# Altium footprint library 3D封装库.PcbLib: 716 footprints (part 44 of 45)
Each footprint in its own frame and in the unit in brackets; x right, y up, seen from the top. Pads: shape width x height; smd on the part's side, far side on the other; paste and mask are expansions set on the pad; w line width, h text height; cw(c..) or ccw(c..) is an arc to the next point about the centre after c.
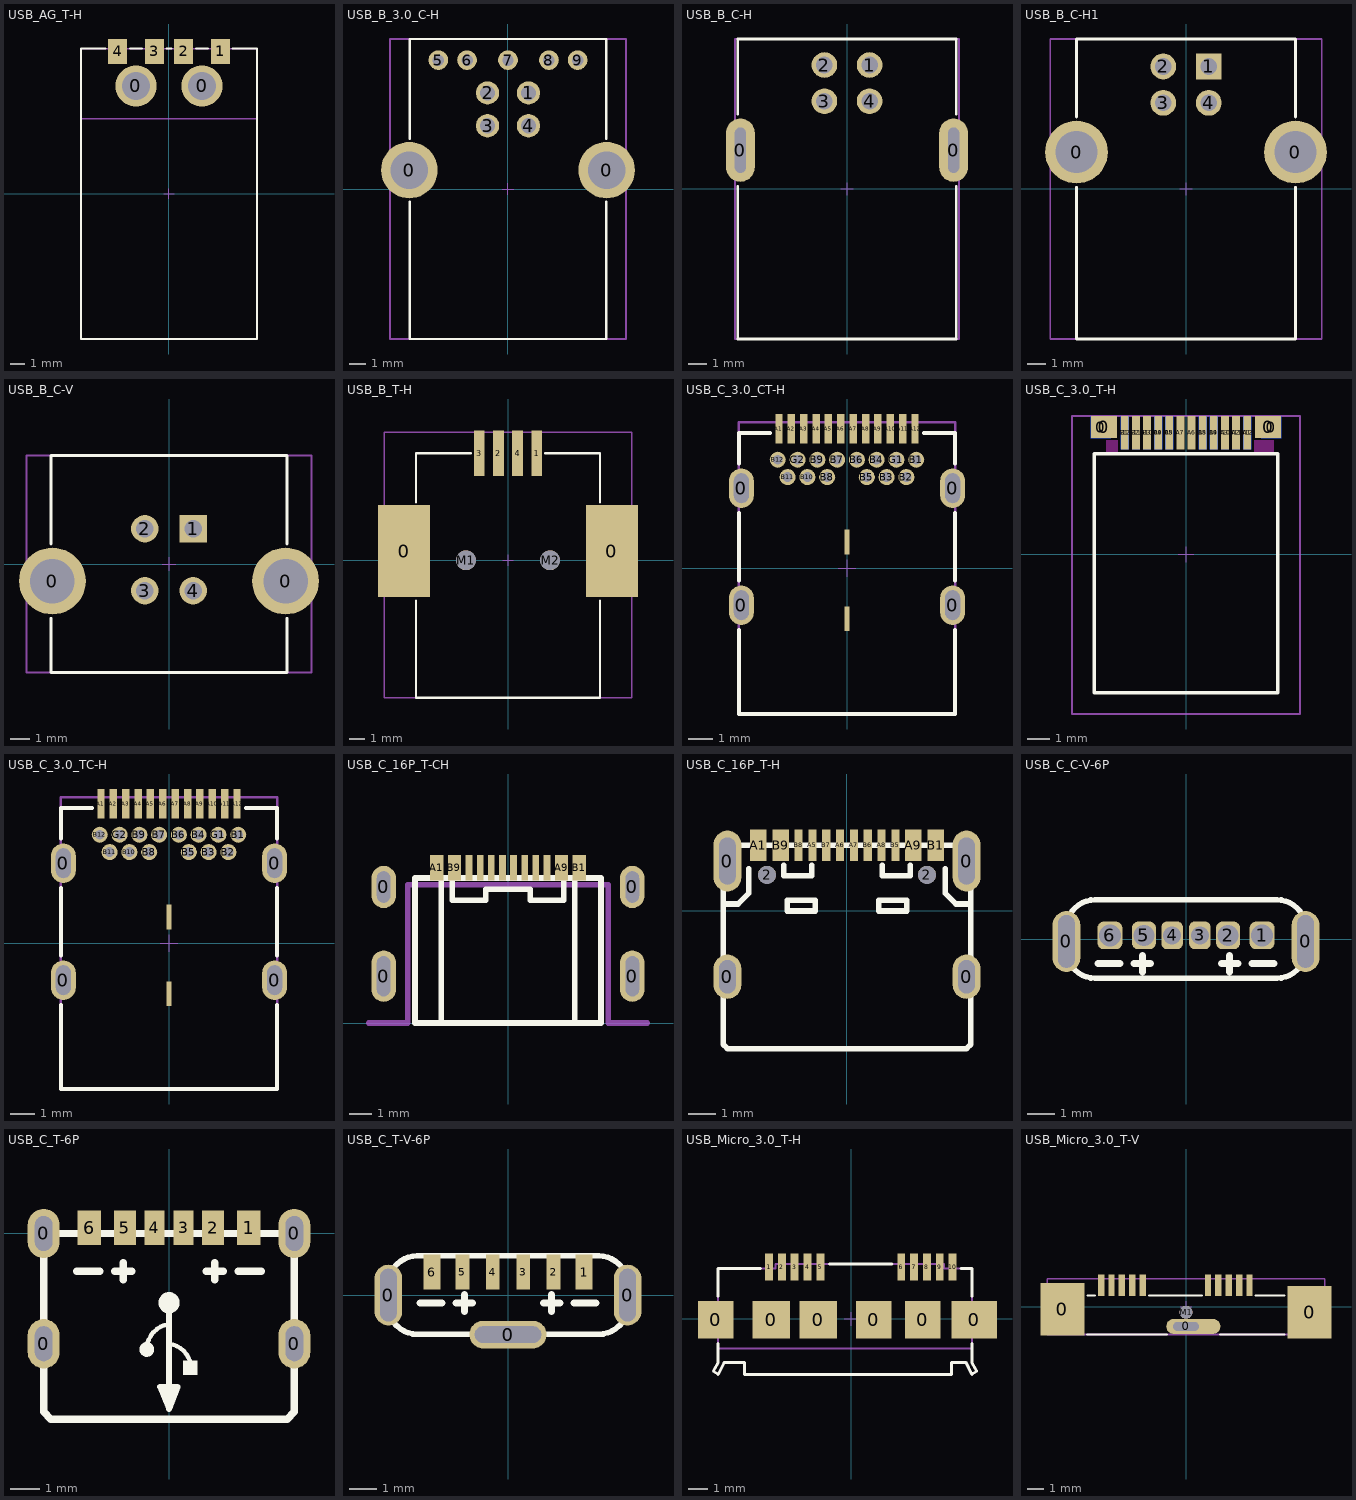
[diagram p43: the footprints below, top view; thin cyan lines are the x and y axes]

## USB_AG_T-H [mm] "USB 2.0 Plug Type A SMT with Clip"
height 19.8
pads (6):
  round 2.8 hole 1.9: 0(-2.25,7.35) 0(2.25,7.35)
  rect 1.3x1.7 smd: 1(3.5,9.7) 2(1,9.7) 3(-1,9.7) 4(-3.5,9.7)
Top Overlay:
  lines w0.15: -4.35,9.9 -6,9.9 -6,-9.9 6,-9.9 6,9.9 4.35,9.9 ; -2.65,9.9 -1.85,9.9 ; -0.15,9.9 0.15,9.9 ; 1.85,9.9 2.65,9.9
Mechanical 1:
  lines w0.1: -6,5.1 6,5.1
  text "PCB Edge" at -2,4.05 h1
Mechanical 13:
  lines w0.1: -6,-9.9 6,-9.9 6,9.9 -6,9.9 -6,-9.9
Mechanical 15:
  lines w0.05: -0.35,0 0.35,0 ; 0,-0.35 0,0.35
3D body "629004113921.stp": height 2.25, standoff -2.25, extent -6,-9.9 6,9.9

## USB_B_3.0_C-H [mm] "USB 3.0 Type B Horizontal"
height 12.9
pads (11):
  round 3.45 hole 2.3: 0(-6.02,1.15) 0(6.02,1.15)
  round 1.42 hole 0.92: 1(1.25,5.86) 2(-1.25,5.86) 3(-1.25,3.86) 4(1.25,3.86)
  round 1.2 hole 0.7: 5(-4.25,7.86) 6(-2.5,7.86) 7(0,7.86) 8(2.5,7.86) 9(4.25,7.86)
Top Overlay:
  lines w0.15: -6,-0.78 -6,-9.15 6,-9.15 6,-0.78 ; -6,3.07 -6,9.15 6,9.15 6,3.07
Mechanical 13:
  lines w0.1: -7.2,-9.15 7.2,-9.15 7.2,9.15 -7.2,9.15 -7.2,-9.15
Mechanical 15:
  lines w0.05: -0.35,0 0.35,0 ; 0,-0.35 0,0.35
3D body "692221030100.stp": height 12.95, standoff -3.18, extent -7.2,-9.15 7.2,9.15

## USB_B_C-H [mm] "USB Type B Horizontal THR"
height 11
pads (6):
  oval 1.6x3.5 hole 0.6 slot 2.5 at 90 deg: 0(-5.9,2.15) 0(5.9,2.15)
  round 1.42 hole 0.92: 1(1.25,6.86) 2(-1.25,6.86) 3(-1.25,4.86) 4(1.25,4.86)
Top Overlay:
  lines w0.15: -6.05,0.15 -6.05,-8.3 6.05,-8.3 6.05,0.15 ; -6.05,4.15 -6.05,8.3 6.05,8.3 6.05,4.15
Mechanical 13:
  lines w0.1: -6.2,-8.3 -6.2,8.3 6.2,8.3 6.2,-8.3 -6.2,-8.3
Mechanical 15:
  lines w0.05: -0.35,0 0.35,0 ; 0,-0.35 0,0.35
3D body "61410416121R.stp": height 11.1, standoff -2.1, extent -6.2,-8.3 6.2,8.3

## USB_B_C-H1 [mm] "USB 2.0 Type B Horizontal"
height 11.05
pads (6):
  round 3.45 hole 2.3: 0(-6.02,2.03) 0(6.02,2.03)
  rect 1.42x1.42 hole 0.92: 1(1.25,6.74)
  round 1.42 hole 0.92: 2(-1.25,6.74) 3(-1.25,4.74) 4(1.25,4.74)
Top Overlay:
  lines w0.15: -6.02,0.1 -6.02,-8.25 6.02,-8.25 6.02,0.1 ; -6.02,3.96 -6.02,8.25 6.02,8.25 6.02,3.96
Mechanical 13:
  lines w0.1: -7.47,-8.25 7.47,-8.25 7.47,8.25 -7.47,8.25 -7.47,-8.25
Mechanical 15:
  lines w0.05: -0.35,0 0.35,0 ; 0,-0.35 0,0.35
3D body "61400416121.stp": height 11.1, standoff -3.76, extent -7.484,-8.25 7.484,8.25

## USB_B_C-V [mm] "USB 2.0 Type B Vertical"
height 16.1
pads (6):
  round 3.45 hole 2.3: 0(-6.02,-0.88) 0(6.02,-0.88)
  rect 1.42x1.42 hole 0.92: 1(1.25,1.82)
  round 1.42 hole 0.92: 2(-1.25,1.82) 3(-1.25,-1.38) 4(1.25,-1.38)
Top Overlay:
  lines w0.15: -6.1,-2.8 -6.1,-5.6 6.1,-5.6 6.1,-2.8 ; -6.1,1.04 -6.1,5.6 6.1,5.6 6.1,1.04
Mechanical 13:
  lines w0.1: -7.35,-5.6 -7.35,5.6 7.35,5.6 7.35,-5.6 -7.35,-5.6
Mechanical 15:
  lines w0.05: -0.35,0 0.35,0 ; 0,-0.35 0,0.35
3D body "61400413321.stp": height 16.15, standoff -4.17, extent -7.35,-5.6 7.35,5.6

## USB_B_T-H [mm] "USB 2.0 Type B SMT Horizontal"
height 11.5
pads (8):
  rect 3.4x6.04 smd: 0(-6.8,0.6) 0(6.8,0.6)
  rect 0.7x3 smd: 1(1.875,7) 2(-0.625,7) 3(-1.875,7) 4(0.625,7)
  round 1.3 hole 1.3 unplated: M1(-2.75,0) M2(2.75,0)
Top Overlay:
  lines w0.15: -6.02,-2.64 -6.02,-9 6.02,-9 6.02,-2.64 ; -6.02,3.8 -6.02,7 -2.43,7 ; 2.43,7 6.02,7 6.02,3.8
Mechanical 13:
  lines w0.1: -8.1,-9 8.1,-9 8.1,8.388 -8.1,8.388 -8.1,-9
Mechanical 15:
  lines w0.05: -0.35,0 0.35,0 ; 0,-0.35 0,0.35
3D body "62910416121.stp": height 11.16, standoff -0.81, extent -8.1,-9 8.1,8.388

## USB_C_3.0_CT-H [mm] "USB 3.1 Type C Receptacle Horizontal THR"
height 2.96
pads (32):
  oval 1x1.6 hole 0.6 slot 1.2 at 90 deg: 0(-4.27,-1.495) 0(-4.27,3.235) 0(4.27,-1.495) 0(4.27,3.235)
  rect 0.3x1.2 smd: A1(-2.75,5.635) A2(-2.25,5.635) A3(-1.75,5.635) A4(-1.25,5.635) A5(-0.75,5.635) A6(-0.25,5.635) A7(0.25,5.635) A8(0.75,5.635) A9(1.25,5.635) A10(1.75,5.635) A11(2.25,5.635) A12(2.75,5.635)
  round 0.65 hole 0.4: B1(2.8,4.385) B2(2.4,3.685) B3(1.6,3.685) B4(1.2,4.385) B5(0.8,3.685) B6(0.4,4.385) B7(-0.4,4.385) B8(-0.8,3.685) B9(-1.2,4.385) B10(-1.6,3.685) B11(-2.4,3.685) B12(-2.8,4.385) G1(2,4.385) G2(-2,4.385)
  rect 0.2x1 smd: ""(0,-2.045) ""(0,1.055)
Top Overlay:
  lines w0.15: -4.37,-2.485 -4.37,-5.895 4.37,-5.895 4.37,-2.485 ; -4.37,-0.495 -4.37,2.245 ; -4.37,4.225 -4.37,5.465 -3.1,5.465 ; 3.1,5.465 4.37,5.465 4.37,4.225 ; 4.37,-0.495 4.37,2.245
Mechanical 1:
  text "PCB Thickness 1.0mm" at -3.15,-6.65 h0.76
Mechanical 13:
  lines w0.1: -4.37,-5.895 -4.37,5.895 4.37,5.895 4.37,-5.895 -4.37,-5.895
Mechanical 15:
  lines w0.05: -0.35,0 0.35,0 ; 0,-0.35 0,0.35
3D body "632723100011.stp": height 3.05, standoff -1.81, extent -4.37,-5.895 4.37,5.899

## USB_C_3.0_T-H [mm] "USB 3.1 Type C Plug Horizontal SMT"
height 2.4
pads (26):
  rect 0.9x1 smd far side: 0(-3.825,5.725) 0(3.825,5.725)
  rect 1.18x1 smd: 0(-3.69,5.725) 0(3.69,5.725)
  rect 0.35x1.5 smd: A1(2.75,5.475) A2(2.25,5.475) A3(1.75,5.475) A4(1.25,5.475) A5(0.75,5.475) A6(0.25,5.475) A7(-0.25,5.475) A8(-0.75,5.475) A9(-1.25,5.475) A10(-1.75,5.475) A11(-2.25,5.475) A12(-2.75,5.475)
  rect 0.35x1.5 smd far side: B1(-2.75,5.475) B2(-2.25,5.475) B3(-1.75,5.475) B4(-1.25,5.475) B5(-0.75,5.475) B8(0.75,5.475) B9(1.25,5.475) B10(1.75,5.475) B11(2.25,5.475) B12(2.75,5.475)
Top Overlay:
  lines w0.15: -4.125,-6.225 -4.125,4.525 4.125,4.525 4.125,-6.225 -4.125,-6.225
Bottom Overlay:
  lines w0.15: -4.125,-6.225 4.125,-6.225 4.125,4.525 -4.125,4.525 -4.125,-6.225
Keep-Out Layer:
  board cut-out: -3.58,4.525 -3.58,5.125 -3.08,5.125 -3.08,4.525
  board cut-out: 3.075,4.525 3.075,5.125 3.945,5.125 3.945,4.525
Mechanical 1:
  text "PCB Thickness 0.8mm" at -3.5,-7.7 h0.76
Mechanical 13:
  lines w0.1: -5.125,-7.175 5.125,-7.175 5.125,6.225 -5.125,6.225 -5.125,-7.175
Mechanical 15:
  lines w0.05: -0.35,0 0.35,0 ; 0,-0.35 0,0.35
3D body "632712000011.stp": height 1.75, standoff -2.45, extent -5.125,-7.175 5.125,6.225

## USB_C_3.0_TC-H [mm] "USB 3.1 Type C Receptacle Horizontal THR"
height 2.96
pads (32):
  oval 1x1.6 hole 0.6 slot 1.2 at 90 deg: 0(-4.27,-1.495) 0(-4.27,3.235) 0(4.27,-1.495) 0(4.27,3.235)
  rect 0.3x1.2 smd: A1(-2.75,5.635) A2(-2.25,5.635) A3(-1.75,5.635) A4(-1.25,5.635) A5(-0.75,5.635) A6(-0.25,5.635) A7(0.25,5.635) A8(0.75,5.635) A9(1.25,5.635) A10(1.75,5.635) A11(2.25,5.635) A12(2.75,5.635)
  round 0.65 hole 0.4: B1(2.8,4.385) B2(2.4,3.685) B3(1.6,3.685) B4(1.2,4.385) B5(0.8,3.685) B6(0.4,4.385) B7(-0.4,4.385) B8(-0.8,3.685) B9(-1.2,4.385) B10(-1.6,3.685) B11(-2.4,3.685) B12(-2.8,4.385) G1(2,4.385) G2(-2,4.385)
  rect 0.2x1 smd: ""(0,-2.045) ""(0,1.055)
Top Overlay:
  lines w0.15: -4.37,-2.485 -4.37,-5.895 4.37,-5.895 4.37,-2.485 ; -4.37,-0.495 -4.37,2.245 ; -4.37,4.225 -4.37,5.465 -3.1,5.465 ; 3.1,5.465 4.37,5.465 4.37,4.225 ; 4.37,-0.495 4.37,2.245
Mechanical 1:
  text "PCB Thickness 1.6mm" at -3.5,-6.65 h0.76
Mechanical 13:
  lines w0.1: -4.37,-5.895 -4.37,5.895 4.37,5.895 4.37,-5.895 -4.37,-5.895
Mechanical 15:
  lines w0.05: -0.35,0 0.35,0 ; 0,-0.35 0,0.35
3D body "632723300011.stp": height 3.05, standoff -1.81, extent -4.37,-5.895 4.37,5.899

## USB_C_16P_T-CH [mm]
pads (16):
  oval 1.1x2.3 hole 0.6 slot 1.8 at 90 deg: 0(-5.575,2.1) 0(5.575,2.1)
  oval 1.1x1.9 hole 0.6 slot 1.4 at 90 deg: 0(-5.575,6.1) 0(5.575,6.1)
  rect 0.6x1.15 smd mask+0.05: A1(-3.2,6.96) A9(2.4,6.96) B1(3.2,6.96) B9(-2.4,6.96)
  rect 0.3x1.15 smd mask+0.05: A5(-1.25,6.96) A6(-0.25,6.96) A7(0.25,6.96) A8(1.25,6.96) B5(1.75,6.96) B6(0.75,6.96) B7(-0.75,6.96) B8(-1.75,6.96)
Top Overlay:
  lines w0.254: -3,0 -3,6.5 ; -2.5,6.5 -2.5,5.5 -1,5.5 -1,6 1,6 1,5.5 2.5,5.5 2.5,6.5 ; 3,0 3,6.5 ; -4.17,0 -4.17,6.5 4.17,6.5 4.17,0 -4.17,0
Mechanical 15:
  lines w0.254: -6.25,0 -4.5,0 -4.5,6.2 4.5,6.2 4.5,0 6.25,0
3D body "1768432.stp": height 2.22, standoff -0.94, extent -5.8,0 5.8,7.9

## USB_C_16P_T-H [mm]
pads (18):
  oval 1x1.6 hole 1.2 slot 0.6 at 0 deg: 0(-4.32,-2.375) 0(4.32,-2.375)
  oval 1x2.2 hole 1.7 slot 0.6 at 0 deg: 0(-4.32,1.805) 0(4.32,1.805)
  round 0.65 hole 0.65: 2(-2.89,1.305) 2(2.89,1.305)
  rect 0.6x1.15 smd mask+0.05: A1(-3.2,2.375) A9(2.4,2.375) B1(3.2,2.375) B9(-2.4,2.375)
  rect 0.3x1.15 smd mask+0.05: A5(-1.25,2.375) A6(-0.25,2.375) A7(0.25,2.375) A8(1.25,2.375) B5(1.75,2.375) B6(0.75,2.375) B7(-0.75,2.375) B8(-1.75,2.375)
Top Overlay:
  lines w0.203: -4.47,0.254 -3.937,0.254 -3.556,0.635 -3.556,1.524 ; -2.286,1.651 -2.286,1.27 -1.27,1.27 -1.27,1.651 ; 1.27,1.651 1.27,1.27 2.286,1.27 2.286,1.651 ; 3.556,1.524 3.556,0.635 3.937,0.254 4.47,0.254 ; -4.47,-4.823 -4.318,-4.975 4.318,-4.975 4.47,-4.823 4.47,2.375 -4.47,2.375 -4.47,-4.823 ; -2.159,0 -1.143,0 -1.143,0.381 -2.159,0.381 -2.159,0 ; 1.143,0 2.159,0 2.159,0.381 1.143,0.381 1.143,0
3D body "User Library-USB Type C Port (SMD Type).sldprt": height 3.25, standoff -0.95, extent -4.47,-5 4.47,2.9

## USB_C_C-V-6P [mm]
pads (8):
  oval 1x2.2 hole 0.6 slot 1.9 at 90 deg: 0(-4.32,-0.09) 0(4.32,-0.09)
  rrect50% 0.9x1 hole 0.8 mask+0.05: 1(2.75,0.13) 6(-2.75,0.13)
  rrect50% 0.86x1 hole 0.76 mask+0.05: 2(1.52,0.13) 5(-1.52,0.13)
  rrect50% 0.77x1 hole 0.65 mask+0.05: 3(0.5,0.13) 4(-0.5,0.13)
Top Overlay:
  lines w0.203: -4.325,-0.374 ccw(c-3.279,-0.374) -3.279,-1.42 3.279,-1.42 ccw(c3.279,-0.374) 4.325,-0.374 4.325,0.374 ccw(c3.279,0.374) 3.279,1.42 -3.279,1.42 ccw(c-3.279,0.374) -4.325,0.374 -4.325,-0.374
  lines w0.254: -3.18,-0.889 -2.38,-0.889 ; -1.88,-0.889 -1.28,-0.889 ; -1.58,-1.189 -1.58,-0.589 ; 1.28,-0.889 1.88,-0.889 ; 1.58,-1.189 1.58,-0.589 ; 2.38,-0.889 3.18,-0.889
3D body "TYPE_C_6p-V-C.STEP": height 6.83, standoff -0.76, extent -4.125,-1.2 4.125,1.2

## USB_C_T-6P [mm]
pads (10):
  oval 1.1x1.7 hole 0.6 slot 1.2 at 90 deg: 0(-4.32,-3.8) 0(-4.32,0) 0(4.32,-3.8) 0(4.32,0)
  rect 0.8x1.2 smd: 1(2.75,0.2) 6(-2.75,0.2)
  rect 0.76x1.2 smd: 2(1.52,0.2) 5(-1.52,0.2)
  rect 0.7x1.2 smd: 3(0.5,0.2) 4(-0.5,0.2)
Top Overlay:
  circle w0.254: c-0.767,-3.997 r0.127
  circle w0.381: c0.002,-2.388 r0.178
  region: 0.987,-4.369 0.477,-4.369 0.477,-4.879 0.987,-4.879
  lines w0.152: -0.768,-3.952 cw(c0.119,-4.004) 0,-3.123 ; 0,-3.8 cw(c-0.119,-4.681) 0.727,-4.411
  lines w0.203: 0,-5.282 0,-6.046 ; 0,-2.523 0,-6.046 ; 0,-6.046 -0.31,-5.284 0.3,-5.284 0,-6.046
  lines w0.254: -3.18,-1.3 -2.38,-1.3 ; -1.88,-1.3 -1.28,-1.3 ; -1.58,-1.6 -1.58,-1 ; 1.28,-1.3 1.88,-1.3 ; 1.58,-1.6 1.58,-1 ; 2.38,-1.3 3.18,-1.3 ; -4.32,-6.15 -4.07,-6.4 4.07,-6.4 4.32,-6.15 4.32,-3.8 4.32,0 -4.32,0 -4.32,-6.15
  lines w0.381: 0,-5.487 0,-5.385
3D body "User Library-USB_Type-C_6pin_Socket.sldprt": height 3.23, standoff -0.48, extent -4.47,-6.4 4.47,0.5

## USB_C_T-V-6P [mm]
pads (9):
  oval 1x2.2 hole 0.6 slot 1.9 at 90 deg: 0(-4.325,0) 0(4.325,0)
  oval 2.8x1 hole 0.6 slot 2.4 at 0 deg: 0(0,-1.43)
  rect 0.6x1.26 smd: 1(2.75,0.83) 6(-2.75,0.83)
  rect 0.5x1.26 smd: 2(1.65,0.83) 3(0.55,0.83) 4(-0.55,0.83) 5(-1.65,0.83)
Top Overlay:
  lines w0.203: -4.325,-0.374 ccw(c-3.279,-0.374) -3.279,-1.42 3.279,-1.42 ccw(c3.279,-0.374) 4.325,-0.374 4.325,0.374 ccw(c3.279,0.374) 3.279,1.42 -3.279,1.42 ccw(c-3.279,0.374) -4.325,0.374 -4.325,-0.374
  lines w0.254: -3.18,-0.289 -2.38,-0.289 ; -1.88,-0.289 -1.28,-0.289 ; -1.58,-0.589 -1.58,0.011 ; 1.28,-0.289 1.88,-0.289 ; 1.58,-0.589 1.58,0.011 ; 2.38,-0.289 3.18,-0.289
3D body "cx60-24s-unit.stp": height 10.58, standoff -0.52, extent -4.125,-1.258 4.125,1.257

## USB_Micro_3.0_T-H [mm] "Micro USB 3.0 Type B Horizontal SMT"
height 2.58
pads (16):
  rect 1.8x1.9 smd: 0(-6.87,-0.045) 0(1.13,-0.045) 0(3.63,-0.045)
  rect 1.9x1.9 smd: 0(-4.07,-0.045) 0(-1.67,-0.045)
  rect 2.3x1.9 smd: 0(6.23,-0.045)
  rect 0.4x1.35 smd: 1(-4.17,2.63) 2(-3.52,2.63) 3(-2.87,2.63) 4(-2.22,2.63) 5(-1.57,2.63) 6(2.53,2.63) 7(3.18,2.63) 8(3.83,2.63) 9(4.48,2.63) 10(5.13,2.63)
Top Overlay:
  lines w0.15: -6.745,-1.25 -6.745,-2.205 -6.995,-2.645 -6.745,-2.805 -6.445,-2.205 -5.405,-2.205 -5.405,-2.805 5.065,-2.805 5.065,-2.205 5.805,-2.205 6.105,-2.805 6.355,-2.645 6.105,-2.205 6.105,-1.25 ; -6.745,1.15 -6.745,2.545 -4.6,2.545 ; -1.1,2.795 2.05,2.795 ; 5.55,2.545 6.105,2.545 6.105,1.15
Mechanical 1:
  lines w0.1: -6.745,-1.495 6.105,-1.495
  text "PCB Edge" at -1.82,-2.308 h0.89
Mechanical 13:
  lines w0.1: -6.995,-2.645 -6.745,-2.205 -6.745,2.545 -3.85,2.545 -3.85,2.795 4.7,2.795 4.7,2.545 6.105,2.545 6.105,-2.205 6.355,-2.645 6.105,-2.805 5.805,-2.205 5.065,-2.205 5.065,-2.805 -5.405,-2.805 -5.405,-2.205 -6.445,-2.205 -6.745,-2.805 -6.995,-2.645
Mechanical 15:
  lines w0.05: -0.35,0 0.35,0 ; 0,-0.35 0,0.35
3D body "692622030100.stp": height 2.84, standoff -0.11, extent -6.87,-2.795 6.872,2.807

## USB_Micro_3.0_T-V [mm] "Micro USB 3.0 Type B Vertical SMT"
height 5.15
pads (14):
  rect 2.75x3.3 smd: 0(-7.75,-0.16) 0(7.75,-0.35)
  oval 3.4x0.95 hole 0.55 slot 1.6 at 0 deg copper offset 0.46,0: 0(0,-1.24)
  rect 0.4x1.35 smd: 1(3.98,1.34) 2(3.33,1.34) 3(2.68,1.34) 4(2.03,1.34) 5(1.38,1.34) 6(-2.72,1.34) 7(-3.37,1.34) 8(-4.02,1.34) 9(-4.67,1.34) 10(-5.32,1.34)
  round 0.8 hole 0.8 unplated: M1(0,-0.35)
Top Overlay:
  lines w0.15: -6.18,-1.75 -1.21,-1.75 ; -6.17,0.7 -5.72,0.7 ; -2.32,0.7 0.98,0.7 ; 2.13,-1.75 6.17,-1.75 ; 4.37,0.7 6.17,0.7
Mechanical 13:
  lines w0.1: -8.7,-1.75 -8.7,1.75 8.7,1.75 8.7,-1.75 -8.7,-1.75
Mechanical 15:
  lines w0.05: -0.35,0 0.35,0 ; 0,-0.35 0,0.35
3D body "692622420101.stp": height 5.82, standoff -0.83, extent -8.7,-1.75 8.7,1.75